# Altium schematic symbol library AA_Symbols.SchLib: 1017 symbols (part 3 of 7)
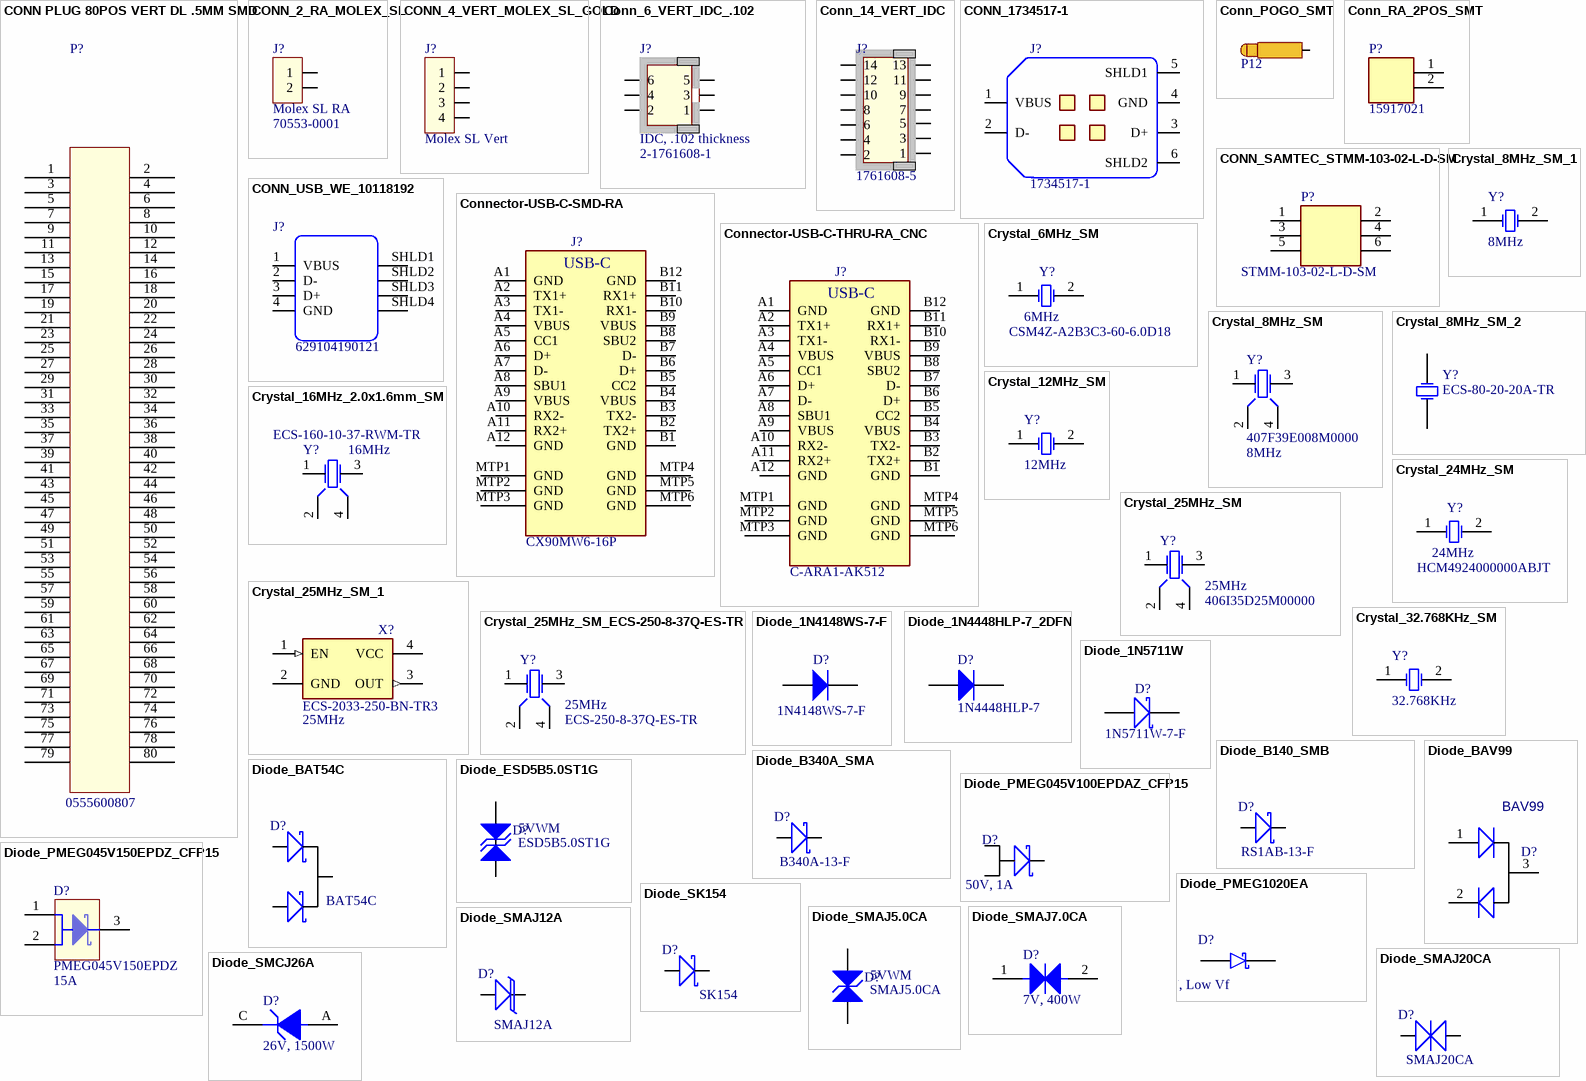
[diagram p44: symbols CONN PLUG 80POS VERT DL .5MM SMD to Diode_SMCJ26A]

## Crystal_25MHz_SM
designator Y?, comment Manufacturer P/N: 406I35D25M00000  (hidden comment: 25MHz)
Crystal, 25MHz ±30ppm, 18pF, 40 Ohm, 4-SMD, Surface Mount; Manufacturer: CTS; Outset P/N: PN-0001696; Value: 25MHz
footprint XTAL_25MHz_CTS_406 (Model 406, 6.0 x 3.5 mm, 4-pin SMT)
pins: 1, 2, 3, 4

## Crystal_25MHz_SM_1
designator X?, comment Manufacturer P/N: ECS-2033-250-BN-TR3  (hidden comment: 25MHz)
Crystal Oscillator, XO, 25.0000MHZ, CMOS, 4-SMD; Manufacturer: ECS Inc.; Outset P/N: PN-0007134; VALUE: 25MHz
footprint OSC_ECS2520MV
pins: 1 EN (in), 2 GND (power), 3 OUT (out), 4 VCC

## Crystal_25MHz_SM_ECS-250-8-37Q-ES-TR
designator Y?, comment Manufacturer P/N: ECS-250-8-37Q-ES-TR  (hidden comment: 25MHz)
Crystal, 25 MHz ±30ppm Crystal 8pF 100 Ohms 4-SMD, No Lead; Manufacturer: ECS Inc.; Outset P/N: PN-0008216; Value: 25MHz
footprint XTAL_2.0x1.6mm (Crystal, 2.0 x 1.6 mm)
pins: 1, 2, 3, 4

## Crystal_32.768KHz_SM
designator Y?, comment 32.768KHz
Crystal Oscillator, 32.768KHz, 12.5pF, Surface Mount; Manufacturer: ECS Inc; Manufacturer P/N: ECS-.327-12.5-34B; Outset P/N: 0000089
footprint ECX-31B
pins: 1 OSC1, 2 OSC2

## Diode_1N4148WS-7-F
designator D?, comment 1N4148WS-7-F
Diode, Gen Purp, 75V, 150mA, SOD323; Manufacturer: Diodes Inc.; Outset P/N: PN-0007058; Temperature: -65C ~ 150C; Manufacturer P/N: 1N4148WS-7-F; Value: 1N4148WS-7-F
footprint SOD2513X120N (SOD323)
pins: A, K

## Diode_1N4448HLP-7_2DFN
designator D?, comment 1N4448HLP-7
Diode, 1N4448HLP-7, 80V, 125mA, 2DFN, Gen Purpose; Manufacturer: Diodes Incorporated; Outset P/N: PN-0007282; Value: 1N4448HLP-7; CURRENT: 125mA; Manufacturer P/N: 1N4448HLP-7
footprint DIODFN2_100X60X26L25X50N (514AG) (Diode, Dual Flat No-Lead (DFN 2 Pin); 2 pin, 1.00 mm L X 0.60 mm W X 0.26 mm H body)
pins: A, K

## Diode_1N5711W
designator D?, comment 1N5711W-7-F
Diode, Schottky, 70V, 15mA, SOD-123; Manufacturer: Diodes Inc; Outset P/N: 0000091; Manufacturer P/N: 1N5711W-7-F
footprint SOD_123
pins: 1 A, 2 K

## Diode_B140_SMB
designator D?, comment RS1AB-13-F
Diode, B140, SMB, 50V, 1A; Manufacturer: Diodes Inc; Outset P/N: 0000092; Manufacturer P/N: RS1AB-13-F
footprint DSO-C2/X2.3 (DO-214-AA/SMB; 2 C-Bend Leads; Body 5.3 x 3.6 mm, inc. leads (LxW))
pins: 1 A, 2 K

## Diode_B340A_SMA
designator D?, comment B340A-13-F
Diode, B340A, Schottky, 3A, 40V, SMA; Manufacturer: Diodes Inc; Outset P/N: 0000093; Manufacturer P/N: B340A-13-F
footprint DSO-C2/X2.3 (DO-214-AA/SMB; 2 C-Bend Leads; Body 5.3 x 3.6 mm, inc. leads (LxW))
pins: 1 A, 2 K

## Diode_BAT54C
designator D?, comment BAT54C
Diode, BAT54C, Schottky, 200mA, 30V, SOT-23; Manufacturer: Fairchild Semiconductor; Outset P/N: 0000094; Manufacturer P/N: BAT54C
footprint SOT-23 (SOT-23; 3 Leads; Body 3.0 x 2.6 mm, inc. leads (LxW max))
pins: 1 A, 2 A, 3 K

## Diode_BAV99
designator D?, comment BAV99
Diode, BAV99, 200mA, 70V, SOT-23; Manufacturer: Fairchild Semiconductor; Outset P/N: PN-0002759; Manufacturer P/N: BAV99; Value: BAV99
footprint SOT-23 (SOT-23; 3 Leads; Body 3.0 x 2.6 mm, inc. leads (LxW max))
pins: 1 A, 2 A, 3 K

## Diode_ESD5B5.0ST1G
designator D?, comment Manufacturer P/N: ESD5B5.0ST1G  (hidden comment: 5VWM)
Diode, ESD5B5.0ST1G, TVS, 5VWM, 5.8VBR, 9.2VC, 50W Pk Pulse, SOD-523; Manufacturer: onsemi; Outset P/N: PN-0008194; Temperature: -55C ~ 150C; Power: 50W; VALUE: 5VWM
footprint SODFL160X80X70L30X30N (Diode, Small Outline Diode, Flat Lead (SODFL); 1.20 mm L X 0.80 mm W X 0.70 mm H body)
pins: 1, 2

## Diode_PMEG045V100EPDAZ_CFP15
designator D?, comment 50V, 1A
Diode, CFP15, Schottky, 50V, 1A; Manufacturer: NXP; Manufacturer P/N: PMEG045V100EPDAZ; Outset P/N: PN-0001722; Value: 50V, 1A
footprint CFP15_SOT1289_N (Small Outline Transistor (SOT), 1.065 mm pitch; rect., 3 pin, 5.8 mm L X 4.3 mm W X 0.82 mm H body)
pins: 1 A, 2 A, 3 K

## Diode_PMEG045V150EPDZ_CFP15
designator D?, comment CURRENT: 15A  (hidden comment: PMEG045V150EPDZ)
Diode, Schottky, 45V, 15A, TO-277, CFP15, Fast Recovery; Manufacturer: Nexperia USA Inc.; Outset P/N: PN-0007270; Manufacturer P/N: PMEG045V150EPDZ; VALUE: PMEG045V150EPDZ
footprint DIODFN3_580X430X82L110X120N (Diode, Dual Flat No-Lead, 3.65 mm Pitch, 3 pin; 5.80 mm L X 4.30 mm W X 0.82 mm H Body)
pins: 1, 2, 3

## Diode_PMEG1020EA
designator D?, comment 2A, 10V, Low Vf
Diode, 2A, 10V, Ultra-low Vf; Manufacturer: Nexperia; Manufacturer P/N: PMEG1020EA,115; Outset P/N: PN-0002784; Value: 2A, 10V, Low Vf
footprint SODFL250X110-2N (SODFL, 2-Leads, Body 1.25x2.50mm, IPC Medium Density)
pins: A, K

## Diode_SK154
designator D?, comment SK154
Diode, SK154, 40V, 15A, DO-241AB; Manufacturer: Micro Commerical Co; Manufacturer P/N: SK154-TP; Outset P/N: 0000095
footprint SK154
pins: 1 A, 2 K

## Diode_SMAJ5.0CA
designator D?, comment Manufacturer P/N: SMAJ5.0CA  (hidden comment: 5VWM)
Diode, SMAJ5.0CA, TVS, 5VWM, 6.7VBR, 9.2VC, 43.5A Pk Pulse, 400W Pk Pulse, DO214AC; Manufacturer: Littelfuse Inc.; Outset P/N: PN-0007224; Temperature: -55C ~ 150C; Power: 400W; VALUE: 5VWM
footprint DIOM5127X229N_NP (DO-214AC_SMA) (Diode,Molded Body;5.105mm L X 2.665mm W X 2.29mm H, No Polarity)
pins: 1, 2

## Diode_SMAJ7.0CA
designator D?, comment 7V, 400W
Diode, SMAJ7.0CA, TVS, 7V, 400W, Bi-dir; Manufacturer: Littelfuse Inc; Outset P/N: PN-0001630; Manufacturer P/N: SMAJ7.0CA; Value: 7V, 400W
footprint SMAJ7.0CA_DIOM5127X229N_NP (DO-214AC_SMA) (Diode,Molded Body;5.105mm L X 2.665mm W X 2.29mm H, No Polarity)
pins: 1, 2

## Diode_SMAJ12A
designator D?, comment SMAJ12A
Diode, SMAJ12A, TVS, 12V, 400W, SMA; Manufacturer: Littelfuse Inc; Manufacturer P/N: SMAJ12ALF; Outset P/N: 0000096
footprint DO-214AC (Transient Voltage Suppression Diode)
pins: 1 A, 2 K

## Diode_SMAJ20CA
designator D?, comment SMAJ20CA
Diode, SMAJ20CA, TVS, 20V, 400W; Manufacturer: Littelfuse Inc; Outset P/N: 0000097; Manufacturer P/N: SMAJ20CA
footprint DO-214AC (Transient Voltage Suppression Diode)
pins: 1 K, 2 A

## Diode_SMCJ26A
designator D?, comment 26V, 1500W
Diode, SMCJ26A, TVS, 26V, 1500W; Manufacturer: Littelfuse Inc; Outset P/N: PN-0001631; Manufacturer P/N: SMCJ26A; Value: 26V, 1500W
footprint SMCJ26A_DIOM7959X262N (DO-214AB_SMC) (Diode,Molded Body;7.94mm L X 5.905mm W X 2.62mm H)
pins: A, C

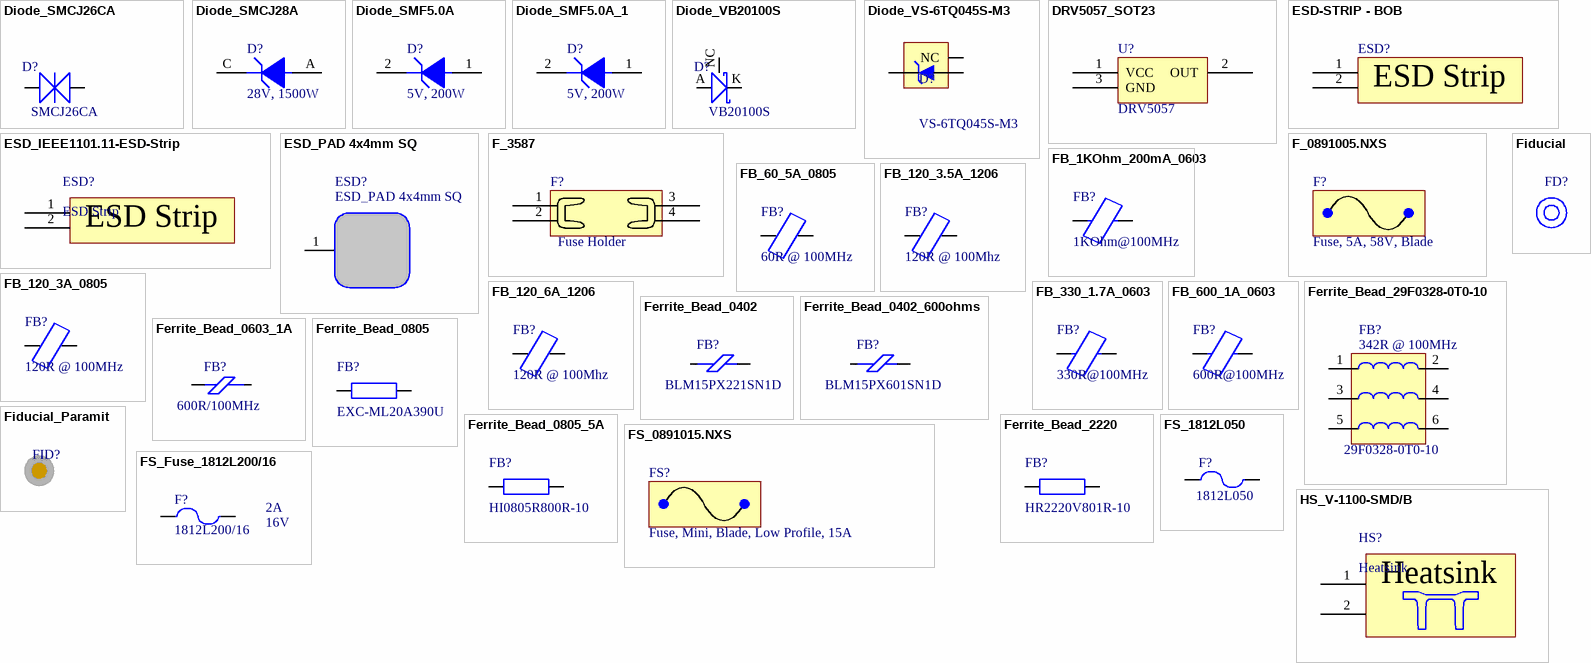
[diagram p12: symbols Diode_SMCJ26CA to HS_V-1100-SMD/B]

## Diode_SMCJ26CA
designator D?, comment SMCJ26CA
Diode, SMCJ26CA, Transient Voltage Supressor 26V; Manufacturer: Littelfuse Inc; Outset P/N: 0000098; Manufacturer P/N: SMCJ26CA
footprint SMC_Bidirectional
pins: 1, 2

## Diode_SMCJ28A
designator D?, comment 28V, 1500W
Diode, SMCJ28A, TVS, 28V, 1500W; Manufacturer: Littelfuse Inc; Outset P/N: PN-0001749; Manufacturer P/N: SMCJ28A; Value: 28V, 1500W
footprint SMCJ26A_DIOM7959X262N (DO-214AB_SMC) (Diode,Molded Body;7.94mm L X 5.905mm W X 2.62mm H)
pins: A, C

## Diode_SMF5.0A
designator D?, comment 5V, 200W
Diode, SMF5.0A, TVS, 5V, 200W; Manufacturer: Littelfuse Inc; Outset P/N: PN-0003669; Manufacturer P/N: SMF5.0A; Value: 5V, 200W
footprint SOD_123
pins: 1 A, 2 K

## Diode_SMF5.0A_1
designator D?, comment 5V, 200W
Diode, SMF5.0A, TVS, 5V, 200W; Manufacturer: Littelfuse Inc; Outset P/N: PN-0003669; Manufacturer P/N: SMF5.0A; Value: 5V, 200W
footprint SOD_123
pins: 1 A, 2 K

## Diode_VB20100S
designator D?, comment VB20100S
Diode, Schottky, 20A 100V, TO-263AB; Manufacturer: Vishay; Manufacturer P/N: VB20100S-E3/8W; Outset P/N: 0000099
footprint TO-263AB (Diode)
pins: A, K, NC

## Diode_VS-6TQ045S-M3
designator D?, comment VS-6TQ045S-M3
DIODE SCHOTTKY 45V 6A TO263AB; Manufacturer: Vishay General Semiconductor; Value: 45V, 6W; Manufacturer P/N: VS-6TQ045S-M3
footprint SOD_123
pins: 1 NC, 2, 3

## DRV5057_SOT23
designator U?, comment DRV5057
footprint SOT23-3P95_237X112L40X40N (Small Outline Transistor, SOT-23 Type, 0.95 mm pitch; 3 pin, 2.92 mm L X 1.30 mm W X 1.12 mm H body)
pins: 1 VCC, 2 OUT, 3 GND

## ESD-STRIP - BOB
designator ESD?, comment ESD Strip  (value not drawn)  (no BOM)
EESD strip BOB, No BOM; Manufacturer: N/A; Value: ESD Strip; Manufacturer P/N: N/A
footprint ESD-STRIP - BOB (ESD strip for BOBs)
pins: 1, 2

## ESD_IEEE1101.11-ESD-Strip
designator ESD?, comment ESD Strip  (no BOM)
Electrostatic Discharge, IEEE 1101.11 compliant ESD strip, No BOM; Manufacturer: N/A; Value: ESD Strip; Manufacturer P/N: N/A
footprint ESD-STRIP (IEEE 1101.10 compliant ESD strip)
pins: 1, 2

## ESD_PAD 4x4mm SQ
designator ESD?  (no BOM)
Manufacturer: Nuvation; Value: ESD_PAD 4x4mm SQ
footprint ESD_PAD (ESD PAD 4mm x 4mm Square)
pins: 1

## F_3587
designator F?, comment Fuse Holder
Fuse Holder, 20A, Blade, Keystone 3587; Manufacturer: Keystone Electronics; Value: 3587; Outset P/N: PN-0001729; Manufacturer P/N: 3587
footprint F_3587 (Footprint not found)
pins: 1 (power), 2 (power), 3 (power), 4 (power)

## F_0891005.NXS
designator F?, comment Fuse, 5A, 58V, Blade  (mechanical)
Manufacturer: Littelfuse; Value: 0891005.NXS; Outset P/N: PN-0001777; Manufacturer P/N: 0891005.NXS

## FB_1KOhm_200mA_0603
designator FB?, comment 1KOhm@100MHz
Ferrite Bead, 200mA, 1KOhm @ 100Mhz, DCR 600 mOhm, 0603; Manufacturer: Wurth; Manufacturer P/N: 74279266; Outset P/N: PN-0005356; Value: 1KOhm@100MHz
footprint FBC_1608_0603_N (Footprint not found)
pins: 1, 2

## FB_60_5A_0805
designator FB?, comment 60R @ 100MHz
Ferrite Bead, 5A, 60 Ohm @ 100Mhz, DCR 20 mOhm, 0805; Manufacturer: Bourns; Manufacturer P/N: MH2029-600Y; Outset P/N: PN-0001635; Value: 60R @ 100MHz
footprint FBC_1012_0805_N (Chip Ferrite, 2-Leads, Body 2.00mm L X 1.25mm W, IPC Medium Density)
pins: 1, 2

## FB_120_3.5A_1206
designator FB?, comment 120R @ 100Mhz
Ferrite Bead, 3.5A, 120 Ohm @ 100Mhz, DCR 10 mOhm, 1206; Manufacturer: Murata; Manufacturer P/N: BLM31PG121SN1L; Outset P/N: PN-0001633; Value: 120R @ 100Mhz
footprint FBC_3216_1206_N (Chip Ferrite, 2-Leads, Body 3.2x1.6mm, IPC Medium Density)
pins: 1, 2

## FB_120_3A_0805
designator FB?, comment 120R @ 100MHz
Ferrite Bead, 3.0A, 120 Ohm @ 100Mhz, DCR 30 mOhm, 0805; Manufacturer: Murata; Manufacturer P/N: BLM21PG121SN1D; Outset P/N: PN-0001634; Value: 120R @ 100MHz
footprint FBC_1012_0805_N (Chip Ferrite, 2-Leads, Body 2.00mm L X 1.25mm W, IPC Medium Density)
pins: 1, 2

## FB_120_6A_1206
designator FB?, comment 120R @ 100Mhz
120 Ohms @ 100 MHz Power Line Ferrite Bead 1206  6A 20mOhm; Manufacturer: Murata; Manufacturer P/N: BLM31KN121SH1L; Outset P/N: PN-0008180; Value: 120R @ 100Mhz; Current: 6A
footprint FBC_3216_1206_N (Chip Ferrite, 2-Leads, Body 3.2x1.6mm, IPC Medium Density)
pins: 1, 2

## FB_330_1.7A_0603
designator FB?, comment 330R@100MHz
330 Ohms @ 100 MHz 1 Power Line Ferrite Bead 0603 (1608 Metric) 1.7A 80mOhm; Manufacturer: Murata Electronics; Manufacturer P/N: BLM18KG331SN1D; Outset P/N: PN-0008195; Value: 330R@100MHz
footprint FBC_1608_0603_N (Footprint not found)
pins: 1, 2

## FB_600_1A_0603
designator FB?, comment 600R@100MHz
Ferrite Bead, 1A, 600 Ohm @ 100Mhz, DCR 200 mOhm, 0603; Manufacturer: Bourns; Manufacturer P/N: MH1608-601Y; Outset P/N: PN-0002772; Value: 600R@100MHz
footprint FBC_1608_0603_N (Footprint not found)
pins: 1, 2

## Ferrite_Bead_29F0328-0T0-10
designator FB?, comment Manufacturer P/N: 29F0328-0T0-10  (hidden comment: 342R @ 100MHz)
Ferrite Bead, 342 ohm @ 100 MHz, 3 lines, 6 Lead, Through Hole; Manufacturer: Laird; Outset P/N: PN-0001636; Value: 342R @ 100MHz
footprint 29F0328-0T0-10_TH100mil6pin (Ferrite, 2.54 mm pitch; 6 pin,  8.34 mm L X 10.88 mm W X 11.43 mm H body)
pins: 1, 2, 3, 4, 5, 6

## Ferrite_Bead_0402
designator FB?, comment BLM15PX221SN1D
Ferrite Bead, 220 Ohm @ 100MHz, 0402, 1 LN; Manufacturer: Murata Electronics; Outset P/N: PN-0007059; DCR_MAX: 0.1; Current: 1.4A; Impedance: 220 Ohm @ 100MHz; Temperature: -55C ~ 125C; Manufacturer P/N: BLM15PX221SN1D; VALUE: BLM15PX221SN1D
footprint FBC1005X55L (0402)
footprint FBC1005X55N (0402)
pins: 1, 2
1 alternate drawing of the same symbol

## Ferrite_Bead_0402_600ohms
designator FB?, comment BLM15PX601SN1D
Ferrite Bead, 600 Ohm @ 100MHz, 0402, 1 LN; Manufacturer: Murata Electronics; Outset P/N: PN-0007171; DCR_MAX: 0.23; Current: 0.9A; Impedance: 600 Ohm @ 100MHz; Temperature: -55C ~ 125C; Manufacturer P/N: BLM15PX601SN1D; VALUE: BLM15PX601SN1D
footprint FBC1005X55L (0402)
footprint FBC1005X55N (0402)
pins: 1, 2
1 alternate drawing of the same symbol

## Ferrite_Bead_0603_1A
designator FB?, comment 600R/100MHz
Ferrite Bead, 1A, 600 Ohms @ 100 MHz, 0603; Manufacturer P/N: MPZ1608S601ATD25; Manufacturer: TDK Corporation; DCR_MAX: 150 m; Outset P/N: PN-0008335; Impedance: 600R/100MHz; Current: 1A; Temperature: -55C ~ 125C; VALUE: 600R/100MHz
footprint FBC1608X95N (0603) (Ferrite Bead,Chip;1.60mm L X 0.80mm W X 0.95mm H, (MPZ1608))
pins: 1, 2
1 alternate drawing of the same symbol

## Ferrite_Bead_0805
designator FB?, comment EXC-ML20A390U
Ferrite Bead, 4A, 39 Ohm @ 100Mhz, 0805; Manufacturer: Panasonic - ECG; Outset P/N: 0000100; Manufacturer P/N: EXC-ML20A390U
footprint CC_2012_0805_N
pins: 1, 2

## Ferrite_Bead_0805_5A
designator FB?, comment HI0805R800R-10
Ferrite Bead, 5A, 80 Ohm @ 100Mhz, 0805; Manufacturer: Laird; Outset P/N: 0000101; Manufacturer P/N: HI0805R800R-10
footprint RC_2012_0805_N
pins: 1, 2

## Ferrite_Bead_2220
designator FB?, comment HR2220V801R-10
Ferrite Bead, 8A, 800 Ohm, 2220; Manufacturer: Laird; Outset P/N: 0000103; Manufacturer P/N: HR2220V801R-10
footprint CC_5650_2220_N
pins: 1, 2

## Fiducial
designator FD?  (value not drawn)  (no BOM)
footprint Fiducial

## Fiducial_Paramit
designator FID?, comment Fiducial  (value not drawn)  (no BOM)
Fiducial without solder paste meeting Paramit DFM requirements; Manufacturer: N/A; Value: Fiducial; Manufacturer P/N: N/A
footprint FIDUCIAL_PARAMIT (Fiducial without solder paste meeting Paramit DFM requirements)

## FS_1812L050
designator F?, comment 1812L050
Fuse, PTC Resettable, 0.5A, 15VDC, 1812; Manufacturer: Littelfuse Inc.; Outset P/N: PN-0007156; VOLTAGE: 15V; Manufacturer P/N: 1812L050; CURRENT: 0.5A; VALUE: 1812L050
footprint Fuse_1812L_MFR_Littel
pins: 1, 2

## FS_0891015.NXS
designator FS?, comment Fuse, Mini, Blade, Low Profile, 15A  (mechanical)
Manufacturer: Littelfuse; Value: 0891015.NXS; Outset P/N: MCS-0871; Manufacturer P/N: 0891015.NXS

## FS_Fuse_1812L200/16
designator F?, comment VOLTAGE: 16V  CURRENT: 2A  (hidden comment: 1812L200/16)
Fuse, PTC Resettable, 2A, 16VDC, 1812; Manufacturer: Littelfuse Inc.; Outset P/N: PN-0007157; Manufacturer P/N: 1812L200/16; VALUE: 1812L200/16
footprint Fuse_1812L_MFR_Littel
pins: 1, 2

## HS_V-1100-SMD/B
designator HS?, comment Heatsink
Heatsink, DPAK, TO-252, SMD Pad, 8.13 x 20.07 x 9.91 mm; Manufacturer: Assmann; Value: V-1100-SMD/B; Outset P/N: PN-0001637; Manufacturer P/N: V-1100-SMD/B
footprint V-1100-SMD/B (Heatsink)
pins: 1, 2

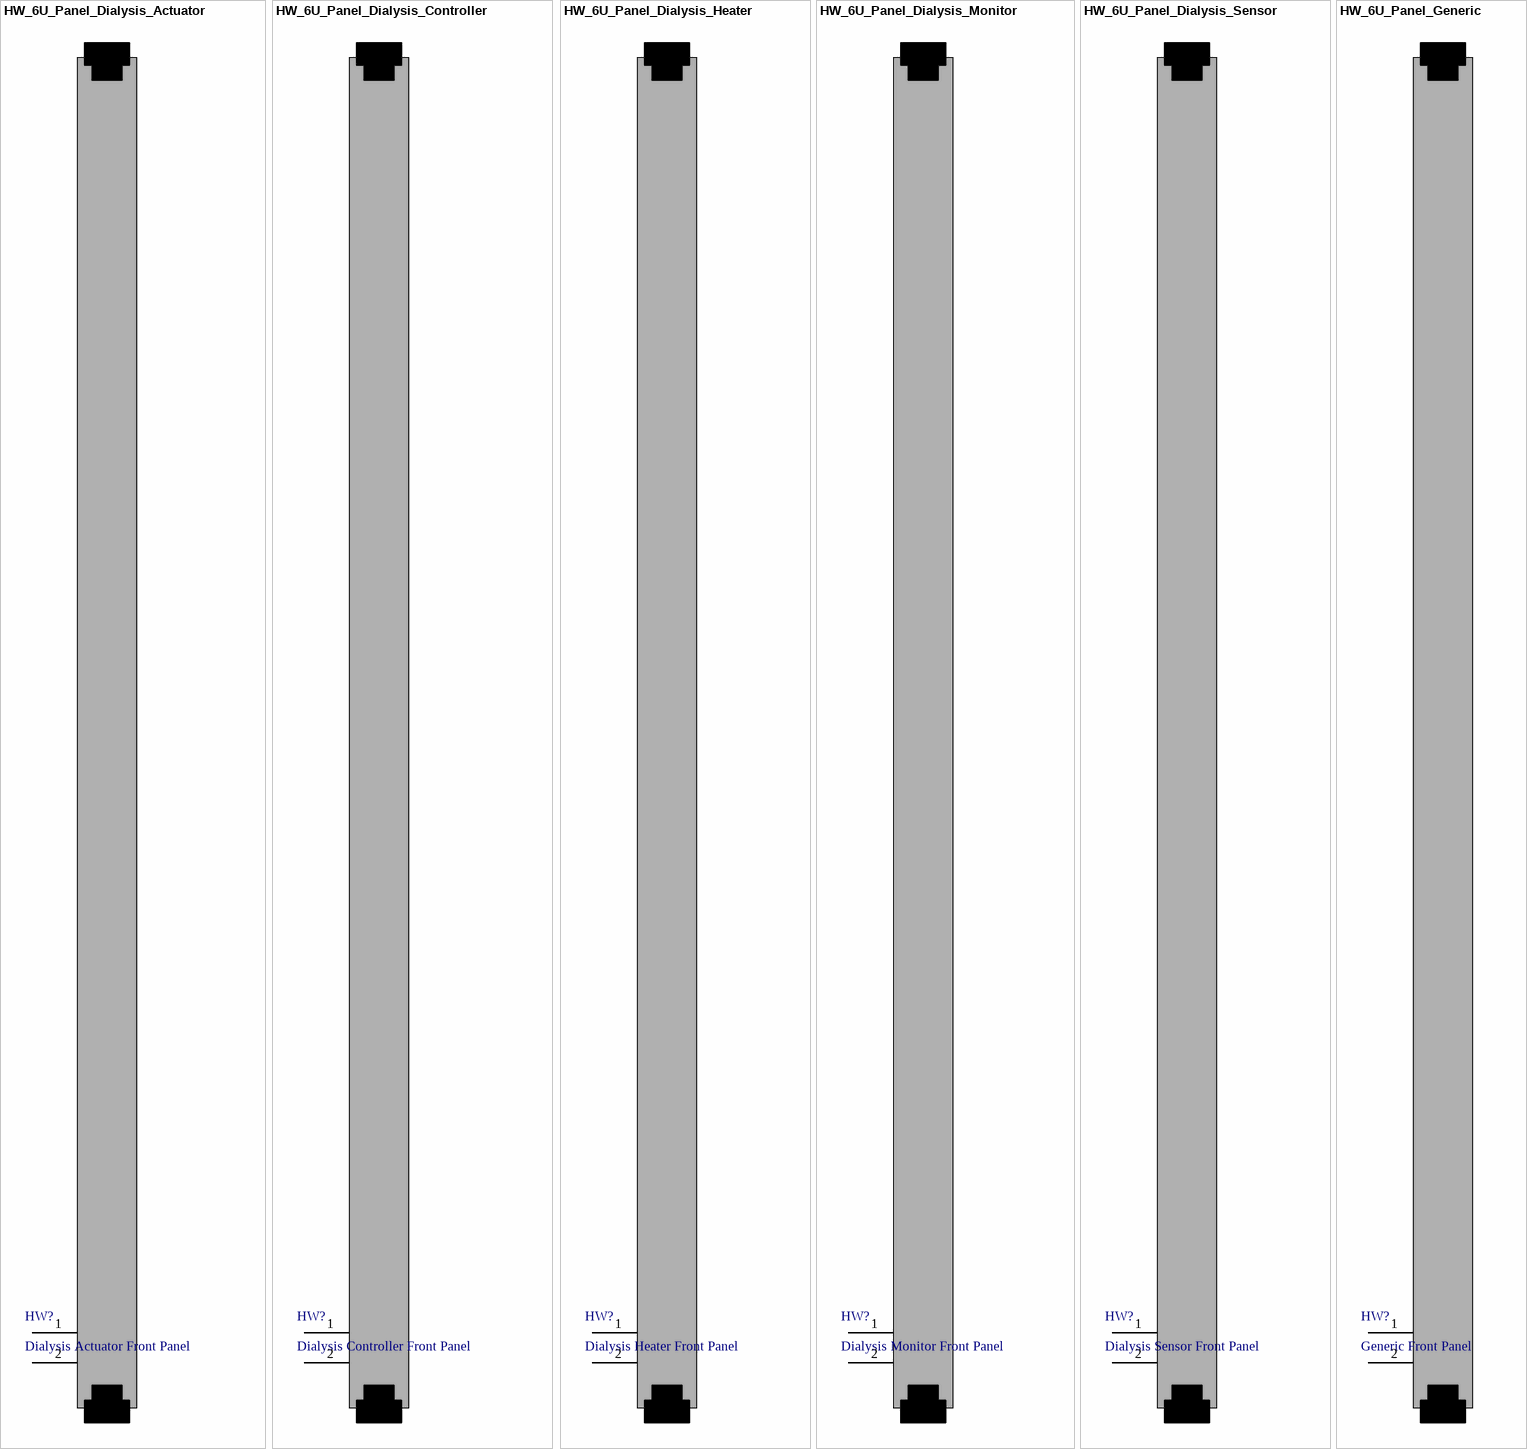
[diagram p13: symbols HW_6U_Panel_Dialysis_Actuator to HW_6U_Panel_Generic]

## HW_6U_Panel_Dialysis_Actuator
designator HW?, comment Dialysis Actuator Front Panel
Hardware, 6 Rack Unit Tall Front Panel For Dialysis Actuator Card, Ejector Handles, Key; Outset P/N: PN-0001929
footprint NUV_TPH1R005PL,L1Q_SOTFL127P600X100-8N (Small Outline Transistor Flat Lead (SOP Advance), 1.27 mm pitch; 8 pin, 5.0 mm L X 5.0 mm W X 1.0 mm H body)
footprint 6U_PNL_MTG (Footprint not found)
pins: 1, 2

## HW_6U_Panel_Dialysis_Controller
designator HW?, comment Dialysis Controller Front Panel
Hardware, 6 Rack Unit Tall Front Panel For Dialysis Controller Card, Ejector Handles, Key; Outset P/N: PN-0001933
footprint NUV_TPH1R005PL,L1Q_SOTFL127P600X100-8N (Small Outline Transistor Flat Lead (SOP Advance), 1.27 mm pitch; 8 pin, 5.0 mm L X 5.0 mm W X 1.0 mm H body)
footprint 6U_PNL_MTG (Footprint not found)
pins: 1, 2

## HW_6U_Panel_Dialysis_Heater
designator HW?, comment Dialysis Heater Front Panel
Hardware, 6 Rack Unit Tall Front Panel For Dialysis Heater Card; Outset P/N: PN-0001926
footprint NUV_TPH1R005PL,L1Q_SOTFL127P600X100-8N (Small Outline Transistor Flat Lead (SOP Advance), 1.27 mm pitch; 8 pin, 5.0 mm L X 5.0 mm W X 1.0 mm H body)
footprint 6U_PNL_MTG (Footprint not found)
pins: 1, 2

## HW_6U_Panel_Dialysis_Monitor
designator HW?, comment Dialysis Monitor Front Panel
Hardware, 6 Rack Unit Tall Front Panel For Dialysis Monitor Card, Ejector Handles, Key; Outset P/N: PN-0001932
footprint NUV_TPH1R005PL,L1Q_SOTFL127P600X100-8N (Small Outline Transistor Flat Lead (SOP Advance), 1.27 mm pitch; 8 pin, 5.0 mm L X 5.0 mm W X 1.0 mm H body)
footprint 6U_PNL_MTG (Footprint not found)
pins: 1, 2

## HW_6U_Panel_Dialysis_Sensor
designator HW?, comment Dialysis Sensor Front Panel
Hardware, 6 Rack Unit Tall Front Panel For Dialysis Sensor Card, Ejector Handles, Key; Outset P/N: PN-0001931
footprint NUV_TPH1R005PL,L1Q_SOTFL127P600X100-8N (Small Outline Transistor Flat Lead (SOP Advance), 1.27 mm pitch; 8 pin, 5.0 mm L X 5.0 mm W X 1.0 mm H body)
footprint 6U_PNL_MTG (Footprint not found)
pins: 1, 2

## HW_6U_Panel_Generic
designator HW?, comment Generic Front Panel  (no BOM)
Hardware, 6 Rack Unit Tall Front Panel For Dialysis Actuator Card, Ejector Handles, Key
footprint NUV_TPH1R005PL,L1Q_SOTFL127P600X100-8N (Small Outline Transistor Flat Lead (SOP Advance), 1.27 mm pitch; 8 pin, 5.0 mm L X 5.0 mm W X 1.0 mm H body)
footprint 6U_PNL_MTG (Footprint not found)
pins: 1, 2
